# Altium schematic symbol library jlcpcb_2025_04_capacitors_extended_1206.schlib: 2503 symbols (part 13 of 14) (continued)
## TCC1206COG100J102ET
designator C?  Capacitance: 10pF  (hidden comment: *)
Capacitor, Ceramic (MLCC), 10pF, ±5%, 1kV, C0G, ±5%, SMD 1206; Manufacturer: CCTC; Manufacturer Part Number: TCC1206COG100J102ET; Package Size: 1206; JLCPCB Basic Part: No; JLCPCB Part Number: C282781; Supplier 1: LCSC; Category: Capacitors - MLCC; Supplier Part Number 1: C282781; Tolerance: ±5%; Voltage Rating: 1kV; Temperature Coefficient: C0G; RoHS: Yes; ComponentLink1Description: Datasheet; ComponentLink1URL: https://wmsc.lcsc.com/wmsc/upload/file/pdf/v2/lcsc/2304140030_CCTC-TCC1206COG100J102ET_C282781.pdf; ComponentLink2Description: JLCPCB Part URL; ComponentLink2URL: https://jlcpcb.com/partdetail/C282781; ComponentLink3Description: LCSC Part URL; ComponentLink3URL: https://lcsc.com/product-detail/Multilayer-Ceramic-Capacitors-MLCC---SMD-SMT_CCTC-CCTC-TCC1206COG100J102ET_C282781.html
footprint CAP-1206 (1206 (3216M) Capacitor)
pins: 1, 2

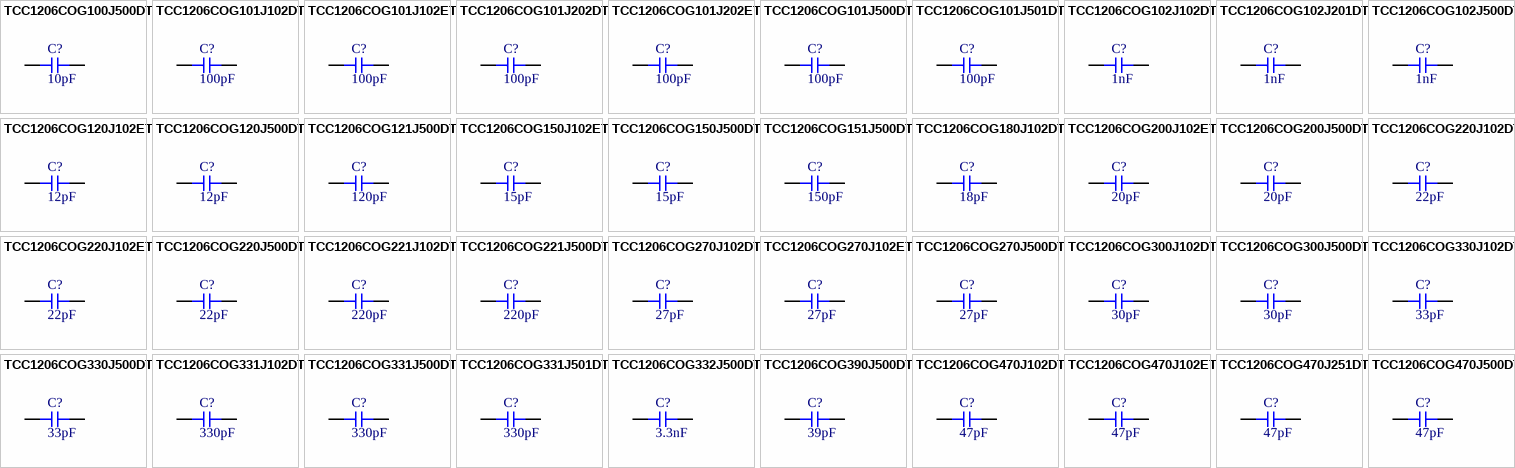
[diagram p56: symbols TCC1206COG100J500DT to TCC1206COG470J500DT]

## TCC1206COG100J500DT
designator C?  Capacitance: 10pF  (hidden comment: *)
Capacitor, Ceramic (MLCC), 10pF, ±5%, 50V, C0G, ±5%, SMD 1206; Manufacturer: CCTC; Manufacturer Part Number: TCC1206COG100J500DT; Package Size: 1206; JLCPCB Basic Part: No; JLCPCB Part Number: C377016; Supplier 1: LCSC; Category: Capacitors - MLCC; Supplier Part Number 1: C377016; Tolerance: ±5%; Voltage Rating: 50V; Temperature Coefficient: C0G; RoHS: Yes; ComponentLink1Description: Datasheet; ComponentLink1URL: https://wmsc.lcsc.com/wmsc/upload/file/pdf/v2/lcsc/2304140030_CCTC-TCC1206COG100J500DT_C377016.pdf; ComponentLink2Description: JLCPCB Part URL; ComponentLink2URL: https://jlcpcb.com/partdetail/C377016; ComponentLink3Description: LCSC Part URL; ComponentLink3URL: https://lcsc.com/product-detail/Multilayer-Ceramic-Capacitors-MLCC---SMD-SMT_CCTC-CCTC-TCC1206COG100J500DT_C377016.html
footprint CAP-1206 (1206 (3216M) Capacitor)
pins: 1, 2

## TCC1206COG101J102DT
designator C?  Capacitance: 100pF  (hidden comment: *)
Capacitor, Ceramic (MLCC), 100pF, ±5%, 1kV, C0G, ±5%, SMD 1206; Manufacturer: CCTC; Manufacturer Part Number: TCC1206COG101J102DT; Package Size: 1206; JLCPCB Basic Part: No; JLCPCB Part Number: C367316; Supplier 1: LCSC; Category: Capacitors - MLCC; Supplier Part Number 1: C367316; Tolerance: ±5%; Voltage Rating: 1kV; Temperature Coefficient: C0G; RoHS: Yes; ComponentLink1Description: Datasheet; ComponentLink1URL: https://wmsc.lcsc.com/wmsc/upload/file/pdf/v2/lcsc/2304140030_CCTC-TCC1206COG101J102DT_C367316.pdf; ComponentLink2Description: JLCPCB Part URL; ComponentLink2URL: https://jlcpcb.com/partdetail/C367316; ComponentLink3Description: LCSC Part URL; ComponentLink3URL: https://lcsc.com/product-detail/Multilayer-Ceramic-Capacitors-MLCC---SMD-SMT_CCTC-CCTC-TCC1206COG101J102DT_C367316.html
footprint CAP-1206 (1206 (3216M) Capacitor)
pins: 1, 2

## TCC1206COG101J102ET
designator C?  Capacitance: 100pF  (hidden comment: *)
Capacitor, Ceramic (MLCC), 100pF, ±5%, 1kV, C0G, ±5%, SMD 1206; Manufacturer: CCTC; Manufacturer Part Number: TCC1206COG101J102ET; Package Size: 1206; JLCPCB Basic Part: No; JLCPCB Part Number: C377018; Supplier 1: LCSC; Category: Capacitors - MLCC; Supplier Part Number 1: C377018; Tolerance: ±5%; Voltage Rating: 1kV; Temperature Coefficient: C0G; RoHS: Yes; ComponentLink1Description: Datasheet; ComponentLink1URL: https://wmsc.lcsc.com/wmsc/upload/file/pdf/v2/lcsc/2304140030_CCTC-TCC1206COG101J102ET_C377018.pdf; ComponentLink2Description: JLCPCB Part URL; ComponentLink2URL: https://jlcpcb.com/partdetail/C377018; ComponentLink3Description: LCSC Part URL; ComponentLink3URL: https://lcsc.com/product-detail/Multilayer-Ceramic-Capacitors-MLCC---SMD-SMT_CCTC-CCTC-TCC1206COG101J102ET_C377018.html
footprint CAP-1206 (1206 (3216M) Capacitor)
pins: 1, 2

## TCC1206COG101J202DT
designator C?  Capacitance: 100pF  (hidden comment: *)
Capacitor, Ceramic (MLCC), 100pF, ±5%, 2kV, C0G, ±5%, SMD 1206; Manufacturer: CCTC; Manufacturer Part Number: TCC1206COG101J202DT; Package Size: 1206; JLCPCB Basic Part: No; JLCPCB Part Number: C2833637; Supplier 1: LCSC; Category: Capacitors - MLCC; Supplier Part Number 1: C2833637; Tolerance: ±5%; Voltage Rating: 2kV; Temperature Coefficient: C0G; RoHS: Yes; ComponentLink1Description: Datasheet; ComponentLink1URL: https://wmsc.lcsc.com/wmsc/upload/file/pdf/v2/lcsc/2105241436_CCTC-TCC1206COG101J202DT_C2833637.pdf; ComponentLink2Description: JLCPCB Part URL; ComponentLink2URL: https://jlcpcb.com/partdetail/C2833637; ComponentLink3Description: LCSC Part URL; ComponentLink3URL: https://lcsc.com/product-detail/Multilayer-Ceramic-Capacitors-MLCC---SMD-SMT_CCTC-CCTC-TCC1206COG101J202DT_C2833637.html
footprint CAP-1206 (1206 (3216M) Capacitor)
pins: 1, 2

## TCC1206COG101J202ET
designator C?  Capacitance: 100pF  (hidden comment: *)
Capacitor, Ceramic (MLCC), 100pF, ±5%, 2kV, C0G, ±5%, SMD 1206; Manufacturer: CCTC; Manufacturer Part Number: TCC1206COG101J202ET; Package Size: 1206; JLCPCB Basic Part: No; JLCPCB Part Number: C282782; Supplier 1: LCSC; Category: Capacitors - MLCC; Supplier Part Number 1: C282782; Tolerance: ±5%; Voltage Rating: 2kV; Temperature Coefficient: C0G; RoHS: Yes; ComponentLink1Description: Datasheet; ComponentLink1URL: https://wmsc.lcsc.com/wmsc/upload/file/pdf/v2/lcsc/2304140030_CCTC-TCC1206COG101J202ET_C282782.pdf; ComponentLink2Description: JLCPCB Part URL; ComponentLink2URL: https://jlcpcb.com/partdetail/C282782; ComponentLink3Description: LCSC Part URL; ComponentLink3URL: https://lcsc.com/product-detail/Multilayer-Ceramic-Capacitors-MLCC---SMD-SMT_CCTC-CCTC-TCC1206COG101J202ET_C282782.html
footprint CAP-1206 (1206 (3216M) Capacitor)
pins: 1, 2

## TCC1206COG101J500DT
designator C?  Capacitance: 100pF  (hidden comment: *)
Capacitor, Ceramic (MLCC), 100pF, ±5%, 50V, C0G, ±5%, SMD 1206; Manufacturer: CCTC; Manufacturer Part Number: TCC1206COG101J500DT; Package Size: 1206; JLCPCB Basic Part: No; JLCPCB Part Number: C377019; Supplier 1: LCSC; Category: Capacitors - MLCC; Supplier Part Number 1: C377019; Tolerance: ±5%; Voltage Rating: 50V; Temperature Coefficient: C0G; RoHS: Yes; ComponentLink1Description: Datasheet; ComponentLink1URL: https://wmsc.lcsc.com/wmsc/upload/file/pdf/v2/lcsc/2304140030_CCTC-TCC1206COG101J500DT_C377019.pdf; ComponentLink2Description: JLCPCB Part URL; ComponentLink2URL: https://jlcpcb.com/partdetail/C377019; ComponentLink3Description: LCSC Part URL; ComponentLink3URL: https://lcsc.com/product-detail/Multilayer-Ceramic-Capacitors-MLCC---SMD-SMT_CCTC-CCTC-TCC1206COG101J500DT_C377019.html
footprint CAP-1206 (1206 (3216M) Capacitor)
pins: 1, 2

## TCC1206COG101J501DT
designator C?  Capacitance: 100pF  (hidden comment: *)
Capacitor, Ceramic (MLCC), 100pF, ±5%, 500V, C0G, ±5%, SMD 1206; Manufacturer: CCTC; Manufacturer Part Number: TCC1206COG101J501DT; Package Size: 1206; JLCPCB Basic Part: No; JLCPCB Part Number: C377020; Supplier 1: LCSC; Category: Capacitors - MLCC; Supplier Part Number 1: C377020; Tolerance: ±5%; Voltage Rating: 500V; Temperature Coefficient: C0G; RoHS: Yes; ComponentLink1Description: Datasheet; ComponentLink1URL: https://wmsc.lcsc.com/wmsc/upload/file/pdf/v2/lcsc/2304140030_CCTC-TCC1206COG101J501DT_C377020.pdf; ComponentLink2Description: JLCPCB Part URL; ComponentLink2URL: https://jlcpcb.com/partdetail/C377020; ComponentLink3Description: LCSC Part URL; ComponentLink3URL: https://lcsc.com/product-detail/Multilayer-Ceramic-Capacitors-MLCC---SMD-SMT_CCTC-CCTC-TCC1206COG101J501DT_C377020.html
footprint CAP-1206 (1206 (3216M) Capacitor)
pins: 1, 2

## TCC1206COG102J102DT
designator C?  Capacitance: 1nF  (hidden comment: *)
Capacitor, Ceramic (MLCC), 1nF, ±5%, 1kV, null, ±5%, SMD 1206; Manufacturer: CCTC; Manufacturer Part Number: TCC1206COG102J102DT; Package Size: 1206; JLCPCB Basic Part: No; JLCPCB Part Number: C5449043; Supplier 1: LCSC; Category: Capacitors - MLCC; Supplier Part Number 1: C5449043; Tolerance: ±5%; Voltage Rating: 1kV; Temperature Coefficient: null; RoHS: Yes; ComponentLink1Description: Datasheet; ComponentLink1URL: https://wmsc.lcsc.com/wmsc/upload/file/pdf/v2/lcsc/2403281714_CCTC-TCC1206COG102J102DT_C5449043.pdf; ComponentLink2Description: JLCPCB Part URL; ComponentLink2URL: https://jlcpcb.com/partdetail/C5449043; ComponentLink3Description: LCSC Part URL; ComponentLink3URL: https://lcsc.com/product-detail/Multilayer-Ceramic-Capacitors-MLCC---SMD-SMT_CCTC-CCTC-TCC1206COG102J102DT_C5449043.html
footprint CAP-1206 (1206 (3216M) Capacitor)
pins: 1, 2

## TCC1206COG102J201DT
designator C?  Capacitance: 1nF  (hidden comment: *)
Capacitor, Ceramic (MLCC), 1nF, ±5%, 200V, C0G, ±5%, SMD 1206; Manufacturer: CCTC; Manufacturer Part Number: TCC1206COG102J201DT; Package Size: 1206; JLCPCB Basic Part: No; JLCPCB Part Number: C377023; Supplier 1: LCSC; Category: Capacitors - MLCC; Supplier Part Number 1: C377023; Tolerance: ±5%; Voltage Rating: 200V; Temperature Coefficient: C0G; RoHS: Yes; ComponentLink1Description: Datasheet; ComponentLink1URL: https://wmsc.lcsc.com/wmsc/upload/file/pdf/v2/lcsc/2304140030_CCTC-TCC1206COG102J201DT_C377023.pdf; ComponentLink2Description: JLCPCB Part URL; ComponentLink2URL: https://jlcpcb.com/partdetail/C377023; ComponentLink3Description: LCSC Part URL; ComponentLink3URL: https://lcsc.com/product-detail/Multilayer-Ceramic-Capacitors-MLCC---SMD-SMT_CCTC-CCTC-TCC1206COG102J201DT_C377023.html
footprint CAP-1206 (1206 (3216M) Capacitor)
pins: 1, 2

## TCC1206COG102J500DT
designator C?  Capacitance: 1nF  (hidden comment: *)
Capacitor, Ceramic (MLCC), 1nF, ±5%, 50V, C0G, ±5%, SMD 1206; Manufacturer: CCTC; Manufacturer Part Number: TCC1206COG102J500DT; Package Size: 1206; JLCPCB Basic Part: No; JLCPCB Part Number: C282783; Supplier 1: LCSC; Category: Capacitors - MLCC; Supplier Part Number 1: C282783; Tolerance: ±5%; Voltage Rating: 50V; Temperature Coefficient: C0G; RoHS: Yes; ComponentLink1Description: Datasheet; ComponentLink1URL: https://wmsc.lcsc.com/wmsc/upload/file/pdf/v2/lcsc/2304140030_CCTC-TCC1206COG102J500DT_C282783.pdf; ComponentLink2Description: JLCPCB Part URL; ComponentLink2URL: https://jlcpcb.com/partdetail/C282783; ComponentLink3Description: LCSC Part URL; ComponentLink3URL: https://lcsc.com/product-detail/Multilayer-Ceramic-Capacitors-MLCC---SMD-SMT_CCTC-CCTC-TCC1206COG102J500DT_C282783.html
footprint CAP-1206 (1206 (3216M) Capacitor)
pins: 1, 2

## TCC1206COG120J102ET
designator C?  Capacitance: 12pF  (hidden comment: *)
Capacitor, Ceramic (MLCC), 12pF, ±5%, 1kV, C0G, ±5%, SMD 1206; Manufacturer: CCTC; Manufacturer Part Number: TCC1206COG120J102ET; Package Size: 1206; JLCPCB Basic Part: No; JLCPCB Part Number: C282784; Supplier 1: LCSC; Category: Capacitors - MLCC; Supplier Part Number 1: C282784; Tolerance: ±5%; Voltage Rating: 1kV; Temperature Coefficient: C0G; RoHS: Yes; ComponentLink1Description: Datasheet; ComponentLink1URL: https://wmsc.lcsc.com/wmsc/upload/file/pdf/v2/lcsc/2304140030_CCTC-TCC1206COG120J102ET_C282784.pdf; ComponentLink2Description: JLCPCB Part URL; ComponentLink2URL: https://jlcpcb.com/partdetail/C282784; ComponentLink3Description: LCSC Part URL; ComponentLink3URL: https://lcsc.com/product-detail/Multilayer-Ceramic-Capacitors-MLCC---SMD-SMT_CCTC-CCTC-TCC1206COG120J102ET_C282784.html
footprint CAP-1206 (1206 (3216M) Capacitor)
pins: 1, 2

## TCC1206COG120J500DT
designator C?  Capacitance: 12pF  (hidden comment: *)
Capacitor, Ceramic (MLCC), 12pF, ±5%, 50V, C0G, ±5%, SMD 1206; Manufacturer: CCTC; Manufacturer Part Number: TCC1206COG120J500DT; Package Size: 1206; JLCPCB Basic Part: No; JLCPCB Part Number: C282785; Supplier 1: LCSC; Category: Capacitors - MLCC; Supplier Part Number 1: C282785; Tolerance: ±5%; Voltage Rating: 50V; Temperature Coefficient: C0G; RoHS: Yes; ComponentLink1Description: Datasheet; ComponentLink1URL: https://wmsc.lcsc.com/wmsc/upload/file/pdf/v2/lcsc/2304140030_CCTC-TCC1206COG120J500DT_C282785.pdf; ComponentLink2Description: JLCPCB Part URL; ComponentLink2URL: https://jlcpcb.com/partdetail/C282785; ComponentLink3Description: LCSC Part URL; ComponentLink3URL: https://lcsc.com/product-detail/Multilayer-Ceramic-Capacitors-MLCC---SMD-SMT_CCTC-CCTC-TCC1206COG120J500DT_C282785.html
footprint CAP-1206 (1206 (3216M) Capacitor)
pins: 1, 2

## TCC1206COG121J500DT
designator C?  Capacitance: 120pF  (hidden comment: *)
Capacitor, Ceramic (MLCC), 120pF, ±5%, 50V, null, ±5%, SMD 1206; Manufacturer: CCTC; Manufacturer Part Number: TCC1206COG121J500DT; Package Size: 1206; JLCPCB Basic Part: No; JLCPCB Part Number: C5448927; Supplier 1: LCSC; Category: Capacitors - MLCC; Supplier Part Number 1: C5448927; Tolerance: ±5%; Voltage Rating: 50V; Temperature Coefficient: null; RoHS: Yes; ComponentLink1Description: Datasheet; ComponentLink1URL: https://wmsc.lcsc.com/wmsc/upload/file/pdf/v2/lcsc/2403281713_CCTC-TCC1206COG121J500DT_C5448927.pdf; ComponentLink2Description: JLCPCB Part URL; ComponentLink2URL: https://jlcpcb.com/partdetail/C5448927; ComponentLink3Description: LCSC Part URL; ComponentLink3URL: https://lcsc.com/product-detail/Multilayer-Ceramic-Capacitors-MLCC---SMD-SMT_CCTC-CCTC-TCC1206COG121J500DT_C5448927.html
footprint CAP-1206 (1206 (3216M) Capacitor)
pins: 1, 2

## TCC1206COG150J102ET
designator C?  Capacitance: 15pF  (hidden comment: *)
Capacitor, Ceramic (MLCC), 15pF, ±5%, 1kV, C0G, ±5%, SMD 1206; Manufacturer: CCTC; Manufacturer Part Number: TCC1206COG150J102ET; Package Size: 1206; JLCPCB Basic Part: No; JLCPCB Part Number: C282786; Supplier 1: LCSC; Category: Capacitors - MLCC; Supplier Part Number 1: C282786; Tolerance: ±5%; Voltage Rating: 1kV; Temperature Coefficient: C0G; RoHS: Yes; ComponentLink1Description: Datasheet; ComponentLink1URL: https://wmsc.lcsc.com/wmsc/upload/file/pdf/v2/lcsc/2304140030_CCTC-TCC1206COG150J102ET_C282786.pdf; ComponentLink2Description: JLCPCB Part URL; ComponentLink2URL: https://jlcpcb.com/partdetail/C282786; ComponentLink3Description: LCSC Part URL; ComponentLink3URL: https://lcsc.com/product-detail/Multilayer-Ceramic-Capacitors-MLCC---SMD-SMT_CCTC-CCTC-TCC1206COG150J102ET_C282786.html
footprint CAP-1206 (1206 (3216M) Capacitor)
pins: 1, 2

## TCC1206COG150J500DT
designator C?  Capacitance: 15pF  (hidden comment: *)
Capacitor, Ceramic (MLCC), 15pF, ±5%, 50V, C0G, ±5%, SMD 1206; Manufacturer: CCTC; Manufacturer Part Number: TCC1206COG150J500DT; Package Size: 1206; JLCPCB Basic Part: No; JLCPCB Part Number: C282787; Supplier 1: LCSC; Category: Capacitors - MLCC; Supplier Part Number 1: C282787; Tolerance: ±5%; Voltage Rating: 50V; Temperature Coefficient: C0G; RoHS: Yes; ComponentLink1Description: Datasheet; ComponentLink1URL: https://wmsc.lcsc.com/wmsc/upload/file/pdf/v2/lcsc/2304140030_CCTC-TCC1206COG150J500DT_C282787.pdf; ComponentLink2Description: JLCPCB Part URL; ComponentLink2URL: https://jlcpcb.com/partdetail/C282787; ComponentLink3Description: LCSC Part URL; ComponentLink3URL: https://lcsc.com/product-detail/Multilayer-Ceramic-Capacitors-MLCC---SMD-SMT_CCTC-CCTC-TCC1206COG150J500DT_C282787.html
footprint CAP-1206 (1206 (3216M) Capacitor)
pins: 1, 2

## TCC1206COG151J500DT
designator C?  Capacitance: 150pF  (hidden comment: *)
Capacitor, Ceramic (MLCC), 150pF, ±5%, 50V, C0G, ±5%, SMD 1206; Manufacturer: CCTC; Manufacturer Part Number: TCC1206COG151J500DT; Package Size: 1206; JLCPCB Basic Part: No; JLCPCB Part Number: C377025; Supplier 1: LCSC; Category: Capacitors - MLCC; Supplier Part Number 1: C377025; Tolerance: ±5%; Voltage Rating: 50V; Temperature Coefficient: C0G; RoHS: Yes; ComponentLink1Description: Datasheet; ComponentLink1URL: https://wmsc.lcsc.com/wmsc/upload/file/pdf/v2/lcsc/2304140030_CCTC-TCC1206COG151J500DT_C377025.pdf; ComponentLink2Description: JLCPCB Part URL; ComponentLink2URL: https://jlcpcb.com/partdetail/C377025; ComponentLink3Description: LCSC Part URL; ComponentLink3URL: https://lcsc.com/product-detail/Multilayer-Ceramic-Capacitors-MLCC---SMD-SMT_CCTC-CCTC-TCC1206COG151J500DT_C377025.html
footprint CAP-1206 (1206 (3216M) Capacitor)
pins: 1, 2

## TCC1206COG180J102DT
designator C?  Capacitance: 18pF  (hidden comment: *)
Capacitor, Ceramic (MLCC), 18pF, ±5%, 1kV, C0G, ±5%, SMD 1206; Manufacturer: CCTC; Manufacturer Part Number: TCC1206COG180J102DT; Package Size: 1206; JLCPCB Basic Part: No; JLCPCB Part Number: C2887022; Supplier 1: LCSC; Category: Capacitors - MLCC; Supplier Part Number 1: C2887022; Tolerance: ±5%; Voltage Rating: 1kV; Temperature Coefficient: C0G; RoHS: Yes; ComponentLink1Description: Datasheet; ComponentLink1URL: https://wmsc.lcsc.com/wmsc/upload/file/pdf/v2/lcsc/2108201530_CCTC-TCC1206COG180J102DT_C2887022.pdf; ComponentLink2Description: JLCPCB Part URL; ComponentLink2URL: https://jlcpcb.com/partdetail/C2887022; ComponentLink3Description: LCSC Part URL; ComponentLink3URL: https://lcsc.com/product-detail/Multilayer-Ceramic-Capacitors-MLCC---SMD-SMT_CCTC-CCTC-TCC1206COG180J102DT_C2887022.html
footprint CAP-1206 (1206 (3216M) Capacitor)
pins: 1, 2

## TCC1206COG200J102ET
designator C?  Capacitance: 20pF  (hidden comment: *)
Capacitor, Ceramic (MLCC), 20pF, ±5%, 1kV, C0G, ±5%, SMD 1206; Manufacturer: CCTC; Manufacturer Part Number: TCC1206COG200J102ET; Package Size: 1206; JLCPCB Basic Part: No; JLCPCB Part Number: C282789; Supplier 1: LCSC; Category: Capacitors - MLCC; Supplier Part Number 1: C282789; Tolerance: ±5%; Voltage Rating: 1kV; Temperature Coefficient: C0G; RoHS: Yes; ComponentLink1Description: Datasheet; ComponentLink1URL: https://wmsc.lcsc.com/wmsc/upload/file/pdf/v2/lcsc/2304140030_CCTC-TCC1206COG200J102ET_C282789.pdf; ComponentLink2Description: JLCPCB Part URL; ComponentLink2URL: https://jlcpcb.com/partdetail/C282789; ComponentLink3Description: LCSC Part URL; ComponentLink3URL: https://lcsc.com/product-detail/Multilayer-Ceramic-Capacitors-MLCC---SMD-SMT_CCTC-CCTC-TCC1206COG200J102ET_C282789.html
footprint CAP-1206 (1206 (3216M) Capacitor)
pins: 1, 2

## TCC1206COG200J500DT
designator C?  Capacitance: 20pF  (hidden comment: *)
Capacitor, Ceramic (MLCC), 20pF, ±5%, 50V, C0G, ±5%, SMD 1206; Manufacturer: CCTC; Manufacturer Part Number: TCC1206COG200J500DT; Package Size: 1206; JLCPCB Basic Part: No; JLCPCB Part Number: C377026; Supplier 1: LCSC; Category: Capacitors - MLCC; Supplier Part Number 1: C377026; Tolerance: ±5%; Voltage Rating: 50V; Temperature Coefficient: C0G; RoHS: Yes; ComponentLink1Description: Datasheet; ComponentLink1URL: https://wmsc.lcsc.com/wmsc/upload/file/pdf/v2/lcsc/2304140030_CCTC-TCC1206COG200J500DT_C377026.pdf; ComponentLink2Description: JLCPCB Part URL; ComponentLink2URL: https://jlcpcb.com/partdetail/C377026; ComponentLink3Description: LCSC Part URL; ComponentLink3URL: https://lcsc.com/product-detail/Multilayer-Ceramic-Capacitors-MLCC---SMD-SMT_CCTC-CCTC-TCC1206COG200J500DT_C377026.html
footprint CAP-1206 (1206 (3216M) Capacitor)
pins: 1, 2

## TCC1206COG220J102DT
designator C?  Capacitance: 22pF  (hidden comment: *)
Capacitor, Ceramic (MLCC), 22pF, ±5%, 1kV, C0G, ±5%, SMD 1206; Manufacturer: CCTC; Manufacturer Part Number: TCC1206COG220J102DT; Package Size: 1206; JLCPCB Basic Part: No; JLCPCB Part Number: C377027; Supplier 1: LCSC; Category: Capacitors - MLCC; Supplier Part Number 1: C377027; Tolerance: ±5%; Voltage Rating: 1kV; Temperature Coefficient: C0G; RoHS: Yes; ComponentLink1Description: Datasheet; ComponentLink1URL: https://wmsc.lcsc.com/wmsc/upload/file/pdf/v2/lcsc/2304140030_CCTC-TCC1206COG220J102DT_C377027.pdf; ComponentLink2Description: JLCPCB Part URL; ComponentLink2URL: https://jlcpcb.com/partdetail/C377027; ComponentLink3Description: LCSC Part URL; ComponentLink3URL: https://lcsc.com/product-detail/Multilayer-Ceramic-Capacitors-MLCC---SMD-SMT_CCTC-CCTC-TCC1206COG220J102DT_C377027.html
footprint CAP-1206 (1206 (3216M) Capacitor)
pins: 1, 2

## TCC1206COG220J102ET
designator C?  Capacitance: 22pF  (hidden comment: *)
Capacitor, Ceramic (MLCC), 22pF, ±5%, 1kV, C0G, ±5%, SMD 1206; Manufacturer: CCTC; Manufacturer Part Number: TCC1206COG220J102ET; Package Size: 1206; JLCPCB Basic Part: No; JLCPCB Part Number: C282790; Supplier 1: LCSC; Category: Capacitors - MLCC; Supplier Part Number 1: C282790; Tolerance: ±5%; Voltage Rating: 1kV; Temperature Coefficient: C0G; RoHS: Yes; ComponentLink1Description: Datasheet; ComponentLink1URL: https://wmsc.lcsc.com/wmsc/upload/file/pdf/v2/lcsc/2304140030_CCTC-TCC1206COG220J102ET_C282790.pdf; ComponentLink2Description: JLCPCB Part URL; ComponentLink2URL: https://jlcpcb.com/partdetail/C282790; ComponentLink3Description: LCSC Part URL; ComponentLink3URL: https://lcsc.com/product-detail/Multilayer-Ceramic-Capacitors-MLCC---SMD-SMT_CCTC-CCTC-TCC1206COG220J102ET_C282790.html
footprint CAP-1206 (1206 (3216M) Capacitor)
pins: 1, 2

## TCC1206COG220J500DT
designator C?  Capacitance: 22pF  (hidden comment: *)
Capacitor, Ceramic (MLCC), 22pF, ±5%, 50V, C0G, ±5%, SMD 1206; Manufacturer: CCTC; Manufacturer Part Number: TCC1206COG220J500DT; Package Size: 1206; JLCPCB Basic Part: No; JLCPCB Part Number: C377028; Supplier 1: LCSC; Category: Capacitors - MLCC; Supplier Part Number 1: C377028; Tolerance: ±5%; Voltage Rating: 50V; Temperature Coefficient: C0G; RoHS: Yes; ComponentLink1Description: Datasheet; ComponentLink1URL: https://wmsc.lcsc.com/wmsc/upload/file/pdf/v2/lcsc/2304140030_CCTC-TCC1206COG220J500DT_C377028.pdf; ComponentLink2Description: JLCPCB Part URL; ComponentLink2URL: https://jlcpcb.com/partdetail/C377028; ComponentLink3Description: LCSC Part URL; ComponentLink3URL: https://lcsc.com/product-detail/Multilayer-Ceramic-Capacitors-MLCC---SMD-SMT_CCTC-CCTC-TCC1206COG220J500DT_C377028.html
footprint CAP-1206 (1206 (3216M) Capacitor)
pins: 1, 2

## TCC1206COG221J102DT
designator C?  Capacitance: 220pF  (hidden comment: *)
Capacitor, Ceramic (MLCC), 220pF, ±5%, 1kV, C0G, ±5%, SMD 1206; Manufacturer: CCTC; Manufacturer Part Number: TCC1206COG221J102DT; Package Size: 1206; JLCPCB Basic Part: No; JLCPCB Part Number: C377029; Supplier 1: LCSC; Category: Capacitors - MLCC; Supplier Part Number 1: C377029; Tolerance: ±5%; Voltage Rating: 1kV; Temperature Coefficient: C0G; RoHS: Yes; ComponentLink1Description: Datasheet; ComponentLink1URL: https://wmsc.lcsc.com/wmsc/upload/file/pdf/v2/lcsc/2304140030_CCTC-TCC1206COG221J102DT_C377029.pdf; ComponentLink2Description: JLCPCB Part URL; ComponentLink2URL: https://jlcpcb.com/partdetail/C377029; ComponentLink3Description: LCSC Part URL; ComponentLink3URL: https://lcsc.com/product-detail/Multilayer-Ceramic-Capacitors-MLCC---SMD-SMT_CCTC-CCTC-TCC1206COG221J102DT_C377029.html
footprint CAP-1206 (1206 (3216M) Capacitor)
pins: 1, 2

## TCC1206COG221J500DT
designator C?  Capacitance: 220pF  (hidden comment: *)
Capacitor, Ceramic (MLCC), 220pF, ±5%, 50V, C0G, ±5%, SMD 1206; Manufacturer: CCTC; Manufacturer Part Number: TCC1206COG221J500DT; Package Size: 1206; JLCPCB Basic Part: No; JLCPCB Part Number: C367313; Supplier 1: LCSC; Category: Capacitors - MLCC; Supplier Part Number 1: C367313; Tolerance: ±5%; Voltage Rating: 50V; Temperature Coefficient: C0G; RoHS: Yes; ComponentLink1Description: Datasheet; ComponentLink1URL: https://wmsc.lcsc.com/wmsc/upload/file/pdf/v2/lcsc/2304140030_CCTC-TCC1206COG221J500DT_C367313.pdf; ComponentLink2Description: JLCPCB Part URL; ComponentLink2URL: https://jlcpcb.com/partdetail/C367313; ComponentLink3Description: LCSC Part URL; ComponentLink3URL: https://lcsc.com/product-detail/Multilayer-Ceramic-Capacitors-MLCC---SMD-SMT_CCTC-CCTC-TCC1206COG221J500DT_C367313.html
footprint CAP-1206 (1206 (3216M) Capacitor)
pins: 1, 2

## TCC1206COG270J102DT
designator C?  Capacitance: 27pF  (hidden comment: *)
Capacitor, Ceramic (MLCC), 27pF, ±5%, 1kV, C0G, ±5%, SMD 1206; Manufacturer: CCTC; Manufacturer Part Number: TCC1206COG270J102DT; Package Size: 1206; JLCPCB Basic Part: No; JLCPCB Part Number: C696897; Supplier 1: LCSC; Category: Capacitors - MLCC; Supplier Part Number 1: C696897; Tolerance: ±5%; Voltage Rating: 1kV; Temperature Coefficient: C0G; RoHS: Yes; ComponentLink1Description: Datasheet; ComponentLink1URL: https://wmsc.lcsc.com/wmsc/upload/file/pdf/v2/lcsc/2304140030_CCTC-TCC1206COG270J102DT_C696897.pdf; ComponentLink2Description: JLCPCB Part URL; ComponentLink2URL: https://jlcpcb.com/partdetail/C696897; ComponentLink3Description: LCSC Part URL; ComponentLink3URL: https://lcsc.com/product-detail/Multilayer-Ceramic-Capacitors-MLCC---SMD-SMT_CCTC-CCTC-TCC1206COG270J102DT_C696897.html
footprint CAP-1206 (1206 (3216M) Capacitor)
pins: 1, 2

## TCC1206COG270J102ET
designator C?  Capacitance: 27pF  (hidden comment: *)
Capacitor, Ceramic (MLCC), 27pF, ±5%, 1kV, C0G, ±5%, SMD 1206; Manufacturer: CCTC; Manufacturer Part Number: TCC1206COG270J102ET; Package Size: 1206; JLCPCB Basic Part: No; JLCPCB Part Number: C377030; Supplier 1: LCSC; Category: Capacitors - MLCC; Supplier Part Number 1: C377030; Tolerance: ±5%; Voltage Rating: 1kV; Temperature Coefficient: C0G; RoHS: Yes; ComponentLink1Description: Datasheet; ComponentLink1URL: https://wmsc.lcsc.com/wmsc/upload/file/pdf/v2/lcsc/2304140030_CCTC-TCC1206COG270J102ET_C377030.pdf; ComponentLink2Description: JLCPCB Part URL; ComponentLink2URL: https://jlcpcb.com/partdetail/C377030; ComponentLink3Description: LCSC Part URL; ComponentLink3URL: https://lcsc.com/product-detail/Multilayer-Ceramic-Capacitors-MLCC---SMD-SMT_CCTC-CCTC-TCC1206COG270J102ET_C377030.html
footprint CAP-1206 (1206 (3216M) Capacitor)
pins: 1, 2

## TCC1206COG270J500DT
designator C?  Capacitance: 27pF  (hidden comment: *)
Capacitor, Ceramic (MLCC), 27pF, ±5%, 50V, C0G, ±5%, SMD 1206; Manufacturer: CCTC; Manufacturer Part Number: TCC1206COG270J500DT; Package Size: 1206; JLCPCB Basic Part: No; JLCPCB Part Number: C377031; Supplier 1: LCSC; Category: Capacitors - MLCC; Supplier Part Number 1: C377031; Tolerance: ±5%; Voltage Rating: 50V; Temperature Coefficient: C0G; RoHS: Yes; ComponentLink1Description: Datasheet; ComponentLink1URL: https://wmsc.lcsc.com/wmsc/upload/file/pdf/v2/lcsc/2304140030_CCTC-TCC1206COG270J500DT_C377031.pdf; ComponentLink2Description: JLCPCB Part URL; ComponentLink2URL: https://jlcpcb.com/partdetail/C377031; ComponentLink3Description: LCSC Part URL; ComponentLink3URL: https://lcsc.com/product-detail/Multilayer-Ceramic-Capacitors-MLCC---SMD-SMT_CCTC-CCTC-TCC1206COG270J500DT_C377031.html
footprint CAP-1206 (1206 (3216M) Capacitor)
pins: 1, 2

## TCC1206COG300J102DT
designator C?  Capacitance: 30pF  (hidden comment: *)
Capacitor, Ceramic (MLCC), 30pF, ±5%, 1kV, null, ±5%, SMD 1206; Manufacturer: CCTC; Manufacturer Part Number: TCC1206COG300J102DT; Package Size: 1206; JLCPCB Basic Part: No; JLCPCB Part Number: C7393971; Supplier 1: LCSC; Category: Capacitors - MLCC; Supplier Part Number 1: C7393971; Tolerance: ±5%; Voltage Rating: 1kV; Temperature Coefficient: null; RoHS: Yes; ComponentLink1Description: Datasheet; ComponentLink1URL: https://wmsc.lcsc.com/wmsc/upload/file/pdf/v2/lcsc/2306211528_CCTC-TCC1206COG300J102DT_C7393971.pdf; ComponentLink2Description: JLCPCB Part URL; ComponentLink2URL: https://jlcpcb.com/partdetail/C7393971; ComponentLink3Description: LCSC Part URL; ComponentLink3URL: https://lcsc.com/product-detail/Multilayer-Ceramic-Capacitors-MLCC---SMD-SMT_CCTC-CCTC-TCC1206COG300J102DT_C7393971.html
footprint CAP-1206 (1206 (3216M) Capacitor)
pins: 1, 2

## TCC1206COG300J500DT
designator C?  Capacitance: 30pF  (hidden comment: *)
Capacitor, Ceramic (MLCC), 30pF, ±5%, 50V, C0G, ±5%, SMD 1206; Manufacturer: CCTC; Manufacturer Part Number: TCC1206COG300J500DT; Package Size: 1206; JLCPCB Basic Part: No; JLCPCB Part Number: C282791; Supplier 1: LCSC; Category: Capacitors - MLCC; Supplier Part Number 1: C282791; Tolerance: ±5%; Voltage Rating: 50V; Temperature Coefficient: C0G; RoHS: Yes; ComponentLink1Description: Datasheet; ComponentLink1URL: https://wmsc.lcsc.com/wmsc/upload/file/pdf/v2/lcsc/2304140030_CCTC-TCC1206COG300J500DT_C282791.pdf; ComponentLink2Description: JLCPCB Part URL; ComponentLink2URL: https://jlcpcb.com/partdetail/C282791; ComponentLink3Description: LCSC Part URL; ComponentLink3URL: https://lcsc.com/product-detail/Multilayer-Ceramic-Capacitors-MLCC---SMD-SMT_CCTC-CCTC-TCC1206COG300J500DT_C282791.html
footprint CAP-1206 (1206 (3216M) Capacitor)
pins: 1, 2

## TCC1206COG330J102DT
designator C?  Capacitance: 33pF  (hidden comment: *)
Capacitor, Ceramic (MLCC), 33pF, ±5%, 1kV, C0G, ±5%, SMD 1206; Manufacturer: CCTC; Manufacturer Part Number: TCC1206COG330J102DT; Package Size: 1206; JLCPCB Basic Part: No; JLCPCB Part Number: C377032; Supplier 1: LCSC; Category: Capacitors - MLCC; Supplier Part Number 1: C377032; Tolerance: ±5%; Voltage Rating: 1kV; Temperature Coefficient: C0G; RoHS: Yes; ComponentLink1Description: Datasheet; ComponentLink1URL: https://wmsc.lcsc.com/wmsc/upload/file/pdf/v2/lcsc/2304140030_CCTC-TCC1206COG330J102DT_C377032.pdf; ComponentLink2Description: JLCPCB Part URL; ComponentLink2URL: https://jlcpcb.com/partdetail/C377032; ComponentLink3Description: LCSC Part URL; ComponentLink3URL: https://lcsc.com/product-detail/Multilayer-Ceramic-Capacitors-MLCC---SMD-SMT_CCTC-CCTC-TCC1206COG330J102DT_C377032.html
footprint CAP-1206 (1206 (3216M) Capacitor)
pins: 1, 2

## TCC1206COG330J500DT
designator C?  Capacitance: 33pF  (hidden comment: *)
Capacitor, Ceramic (MLCC), 33pF, ±5%, 50V, C0G, ±5%, SMD 1206; Manufacturer: CCTC; Manufacturer Part Number: TCC1206COG330J500DT; Package Size: 1206; JLCPCB Basic Part: No; JLCPCB Part Number: C377035; Supplier 1: LCSC; Category: Capacitors - MLCC; Supplier Part Number 1: C377035; Tolerance: ±5%; Voltage Rating: 50V; Temperature Coefficient: C0G; RoHS: Yes; ComponentLink1Description: Datasheet; ComponentLink1URL: https://wmsc.lcsc.com/wmsc/upload/file/pdf/v2/lcsc/2304140030_CCTC-TCC1206COG330J500DT_C377035.pdf; ComponentLink2Description: JLCPCB Part URL; ComponentLink2URL: https://jlcpcb.com/partdetail/C377035; ComponentLink3Description: LCSC Part URL; ComponentLink3URL: https://lcsc.com/product-detail/Multilayer-Ceramic-Capacitors-MLCC---SMD-SMT_CCTC-CCTC-TCC1206COG330J500DT_C377035.html
footprint CAP-1206 (1206 (3216M) Capacitor)
pins: 1, 2

## TCC1206COG331J102DT
designator C?  Capacitance: 330pF  (hidden comment: *)
Capacitor, Ceramic (MLCC), 330pF, ±5%, 1kV, C0G, ±5%, SMD 1206; Manufacturer: CCTC; Manufacturer Part Number: TCC1206COG331J102DT; Package Size: 1206; JLCPCB Basic Part: No; JLCPCB Part Number: C282792; Supplier 1: LCSC; Category: Capacitors - MLCC; Supplier Part Number 1: C282792; Tolerance: ±5%; Voltage Rating: 1kV; Temperature Coefficient: C0G; RoHS: Yes; ComponentLink1Description: Datasheet; ComponentLink1URL: https://wmsc.lcsc.com/wmsc/upload/file/pdf/v2/lcsc/2304140030_CCTC-TCC1206COG331J102DT_C282792.pdf; ComponentLink2Description: JLCPCB Part URL; ComponentLink2URL: https://jlcpcb.com/partdetail/C282792; ComponentLink3Description: LCSC Part URL; ComponentLink3URL: https://lcsc.com/product-detail/Multilayer-Ceramic-Capacitors-MLCC---SMD-SMT_CCTC-CCTC-TCC1206COG331J102DT_C282792.html
footprint CAP-1206 (1206 (3216M) Capacitor)
pins: 1, 2

## TCC1206COG331J500DT
designator C?  Capacitance: 330pF  (hidden comment: *)
Capacitor, Ceramic (MLCC), 330pF, ±5%, 50V, C0G, ±5%, SMD 1206; Manufacturer: CCTC; Manufacturer Part Number: TCC1206COG331J500DT; Package Size: 1206; JLCPCB Basic Part: No; JLCPCB Part Number: C367314; Supplier 1: LCSC; Category: Capacitors - MLCC; Supplier Part Number 1: C367314; Tolerance: ±5%; Voltage Rating: 50V; Temperature Coefficient: C0G; RoHS: Yes; ComponentLink1Description: Datasheet; ComponentLink1URL: https://wmsc.lcsc.com/wmsc/upload/file/pdf/v2/lcsc/2304140030_CCTC-TCC1206COG331J500DT_C367314.pdf; ComponentLink2Description: JLCPCB Part URL; ComponentLink2URL: https://jlcpcb.com/partdetail/C367314; ComponentLink3Description: LCSC Part URL; ComponentLink3URL: https://lcsc.com/product-detail/Multilayer-Ceramic-Capacitors-MLCC---SMD-SMT_CCTC-CCTC-TCC1206COG331J500DT_C367314.html
footprint CAP-1206 (1206 (3216M) Capacitor)
pins: 1, 2

## TCC1206COG331J501DT
designator C?  Capacitance: 330pF  (hidden comment: *)
Capacitor, Ceramic (MLCC), 330pF, ±5%, 500V, C0G, ±5%, SMD 1206; Manufacturer: CCTC; Manufacturer Part Number: TCC1206COG331J501DT; Package Size: 1206; JLCPCB Basic Part: No; JLCPCB Part Number: C377037; Supplier 1: LCSC; Category: Capacitors - MLCC; Supplier Part Number 1: C377037; Tolerance: ±5%; Voltage Rating: 500V; Temperature Coefficient: C0G; RoHS: Yes; ComponentLink1Description: Datasheet; ComponentLink1URL: https://wmsc.lcsc.com/wmsc/upload/file/pdf/v2/lcsc/2304140030_CCTC-TCC1206COG331J501DT_C377037.pdf; ComponentLink2Description: JLCPCB Part URL; ComponentLink2URL: https://jlcpcb.com/partdetail/C377037; ComponentLink3Description: LCSC Part URL; ComponentLink3URL: https://lcsc.com/product-detail/Multilayer-Ceramic-Capacitors-MLCC---SMD-SMT_CCTC-CCTC-TCC1206COG331J501DT_C377037.html
footprint CAP-1206 (1206 (3216M) Capacitor)
pins: 1, 2

## TCC1206COG332J500DT
designator C?  Capacitance: 3.3nF  (hidden comment: *)
Capacitor, Ceramic (MLCC), 3.3nF, ±5%, 50V, C0G, ±5%, SMD 1206; Manufacturer: CCTC; Manufacturer Part Number: TCC1206COG332J500DT; Package Size: 1206; JLCPCB Basic Part: No; JLCPCB Part Number: C380354; Supplier 1: LCSC; Category: Capacitors - MLCC; Supplier Part Number 1: C380354; Tolerance: ±5%; Voltage Rating: 50V; Temperature Coefficient: C0G; RoHS: Yes; ComponentLink1Description: Datasheet; ComponentLink1URL: https://wmsc.lcsc.com/wmsc/upload/file/pdf/v2/lcsc/2304140030_CCTC-TCC1206COG332J500DT_C380354.pdf; ComponentLink2Description: JLCPCB Part URL; ComponentLink2URL: https://jlcpcb.com/partdetail/C380354; ComponentLink3Description: LCSC Part URL; ComponentLink3URL: https://lcsc.com/product-detail/Multilayer-Ceramic-Capacitors-MLCC---SMD-SMT_CCTC-CCTC-TCC1206COG332J500DT_C380354.html
footprint CAP-1206 (1206 (3216M) Capacitor)
pins: 1, 2

## TCC1206COG390J500DT
designator C?  Capacitance: 39pF  (hidden comment: *)
Capacitor, Ceramic (MLCC), 39pF, ±5%, 50V, C0G, ±5%, SMD 1206; Manufacturer: CCTC; Manufacturer Part Number: TCC1206COG390J500DT; Package Size: 1206; JLCPCB Basic Part: No; JLCPCB Part Number: C282793; Supplier 1: LCSC; Category: Capacitors - MLCC; Supplier Part Number 1: C282793; Tolerance: ±5%; Voltage Rating: 50V; Temperature Coefficient: C0G; RoHS: Yes; ComponentLink1Description: Datasheet; ComponentLink1URL: https://wmsc.lcsc.com/wmsc/upload/file/pdf/v2/lcsc/2304140030_CCTC-TCC1206COG390J500DT_C282793.pdf; ComponentLink2Description: JLCPCB Part URL; ComponentLink2URL: https://jlcpcb.com/partdetail/C282793; ComponentLink3Description: LCSC Part URL; ComponentLink3URL: https://lcsc.com/product-detail/Multilayer-Ceramic-Capacitors-MLCC---SMD-SMT_CCTC-CCTC-TCC1206COG390J500DT_C282793.html
footprint CAP-1206 (1206 (3216M) Capacitor)
pins: 1, 2

## TCC1206COG470J102DT
designator C?  Capacitance: 47pF  (hidden comment: *)
Capacitor, Ceramic (MLCC), 47pF, ±5%, 1kV, C0G, ±5%, SMD 1206; Manufacturer: CCTC; Manufacturer Part Number: TCC1206COG470J102DT; Package Size: 1206; JLCPCB Basic Part: No; JLCPCB Part Number: C377038; Supplier 1: LCSC; Category: Capacitors - MLCC; Supplier Part Number 1: C377038; Tolerance: ±5%; Voltage Rating: 1kV; Temperature Coefficient: C0G; RoHS: Yes; ComponentLink1Description: Datasheet; ComponentLink1URL: https://wmsc.lcsc.com/wmsc/upload/file/pdf/v2/lcsc/2304140030_CCTC-TCC1206COG470J102DT_C377038.pdf; ComponentLink2Description: JLCPCB Part URL; ComponentLink2URL: https://jlcpcb.com/partdetail/C377038; ComponentLink3Description: LCSC Part URL; ComponentLink3URL: https://lcsc.com/product-detail/Multilayer-Ceramic-Capacitors-MLCC---SMD-SMT_CCTC-CCTC-TCC1206COG470J102DT_C377038.html
footprint CAP-1206 (1206 (3216M) Capacitor)
pins: 1, 2

## TCC1206COG470J102ET
designator C?  Capacitance: 47pF  (hidden comment: *)
Capacitor, Ceramic (MLCC), 47pF, ±5%, 1kV, C0G, ±5%, SMD 1206; Manufacturer: CCTC; Manufacturer Part Number: TCC1206COG470J102ET; Package Size: 1206; JLCPCB Basic Part: No; JLCPCB Part Number: C282795; Supplier 1: LCSC; Category: Capacitors - MLCC; Supplier Part Number 1: C282795; Tolerance: ±5%; Voltage Rating: 1kV; Temperature Coefficient: C0G; RoHS: Yes; ComponentLink1Description: Datasheet; ComponentLink1URL: https://wmsc.lcsc.com/wmsc/upload/file/pdf/v2/lcsc/2304140030_CCTC-TCC1206COG470J102ET_C282795.pdf; ComponentLink2Description: JLCPCB Part URL; ComponentLink2URL: https://jlcpcb.com/partdetail/C282795; ComponentLink3Description: LCSC Part URL; ComponentLink3URL: https://lcsc.com/product-detail/Multilayer-Ceramic-Capacitors-MLCC---SMD-SMT_CCTC-CCTC-TCC1206COG470J102ET_C282795.html
footprint CAP-1206 (1206 (3216M) Capacitor)
pins: 1, 2

## TCC1206COG470J251DT
designator C?  Capacitance: 47pF  (hidden comment: *)
Capacitor, Ceramic (MLCC), 47pF, ±5%, 250V, C0G, ±5%, SMD 1206; Manufacturer: CCTC; Manufacturer Part Number: TCC1206COG470J251DT; Package Size: 1206; JLCPCB Basic Part: No; JLCPCB Part Number: C282796; Supplier 1: LCSC; Category: Capacitors - MLCC; Supplier Part Number 1: C282796; Tolerance: ±5%; Voltage Rating: 250V; Temperature Coefficient: C0G; RoHS: Yes; ComponentLink1Description: Datasheet; ComponentLink1URL: https://wmsc.lcsc.com/wmsc/upload/file/pdf/v2/lcsc/2304140030_CCTC-TCC1206COG470J251DT_C282796.pdf; ComponentLink2Description: JLCPCB Part URL; ComponentLink2URL: https://jlcpcb.com/partdetail/C282796; ComponentLink3Description: LCSC Part URL; ComponentLink3URL: https://lcsc.com/product-detail/Multilayer-Ceramic-Capacitors-MLCC---SMD-SMT_CCTC-CCTC-TCC1206COG470J251DT_C282796.html
footprint CAP-1206 (1206 (3216M) Capacitor)
pins: 1, 2

## TCC1206COG470J500DT
designator C?  Capacitance: 47pF  (hidden comment: *)
Capacitor, Ceramic (MLCC), 47pF, ±5%, 50V, C0G, ±5%, SMD 1206; Manufacturer: CCTC; Manufacturer Part Number: TCC1206COG470J500DT; Package Size: 1206; JLCPCB Basic Part: No; JLCPCB Part Number: C282797; Supplier 1: LCSC; Category: Capacitors - MLCC; Supplier Part Number 1: C282797; Tolerance: ±5%; Voltage Rating: 50V; Temperature Coefficient: C0G; RoHS: Yes; ComponentLink1Description: Datasheet; ComponentLink1URL: https://wmsc.lcsc.com/wmsc/upload/file/pdf/v2/lcsc/2304140030_CCTC-TCC1206COG470J500DT_C282797.pdf; ComponentLink2Description: JLCPCB Part URL; ComponentLink2URL: https://jlcpcb.com/partdetail/C282797; ComponentLink3Description: LCSC Part URL; ComponentLink3URL: https://lcsc.com/product-detail/Multilayer-Ceramic-Capacitors-MLCC---SMD-SMT_CCTC-CCTC-TCC1206COG470J500DT_C282797.html
footprint CAP-1206 (1206 (3216M) Capacitor)
pins: 1, 2

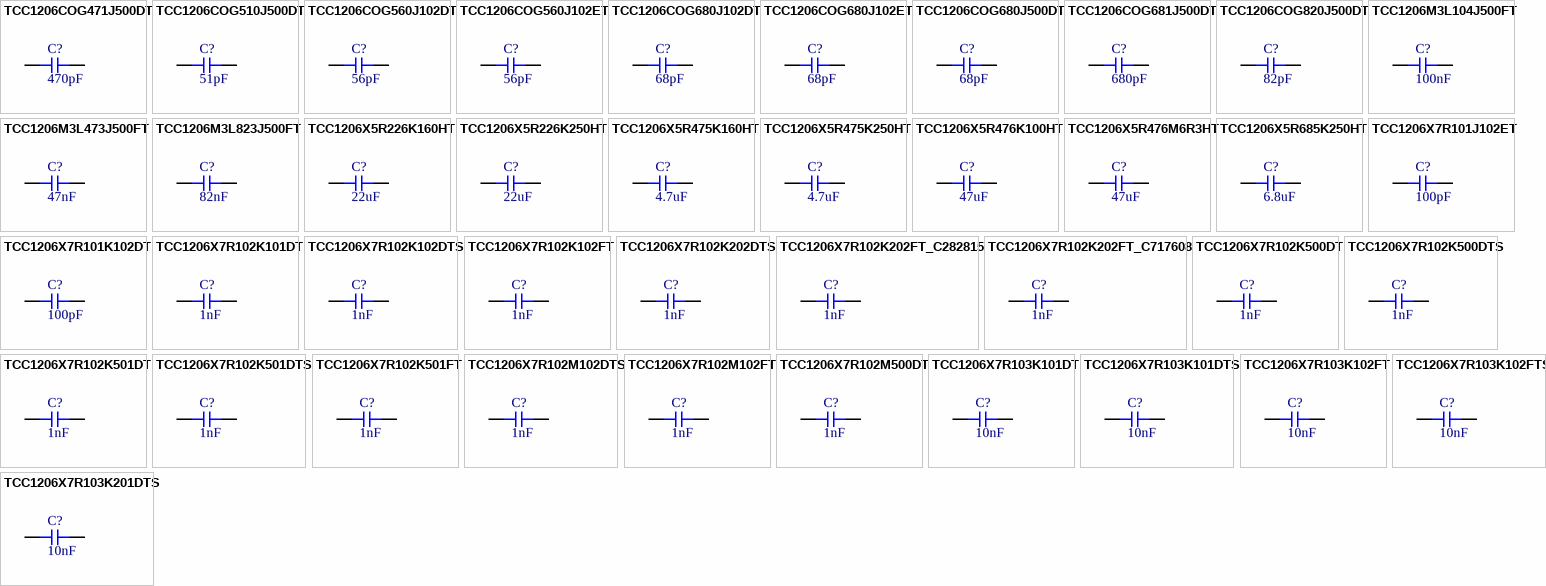
[diagram p57: symbols TCC1206COG471J500DT to TCC1206X7R103K201DTS]

## TCC1206COG471J500DT
designator C?  Capacitance: 470pF  (hidden comment: *)
Capacitor, Ceramic (MLCC), 470pF, ±5%, 50V, C0G, ±5%, SMD 1206; Manufacturer: CCTC; Manufacturer Part Number: TCC1206COG471J500DT; Package Size: 1206; JLCPCB Basic Part: No; JLCPCB Part Number: C282798; Supplier 1: LCSC; Category: Capacitors - MLCC; Supplier Part Number 1: C282798; Tolerance: ±5%; Voltage Rating: 50V; Temperature Coefficient: C0G; RoHS: Yes; ComponentLink1Description: Datasheet; ComponentLink1URL: https://wmsc.lcsc.com/wmsc/upload/file/pdf/v2/lcsc/2304140030_CCTC-TCC1206COG471J500DT_C282798.pdf; ComponentLink2Description: JLCPCB Part URL; ComponentLink2URL: https://jlcpcb.com/partdetail/C282798; ComponentLink3Description: LCSC Part URL; ComponentLink3URL: https://lcsc.com/product-detail/Multilayer-Ceramic-Capacitors-MLCC---SMD-SMT_CCTC-CCTC-TCC1206COG471J500DT_C282798.html
footprint CAP-1206 (1206 (3216M) Capacitor)
pins: 1, 2

## TCC1206COG510J500DT
designator C?  Capacitance: 51pF  (hidden comment: *)
Capacitor, Ceramic (MLCC), 51pF, ±5%, 50V, C0G, ±5%, SMD 1206; Manufacturer: CCTC; Manufacturer Part Number: TCC1206COG510J500DT; Package Size: 1206; JLCPCB Basic Part: No; JLCPCB Part Number: C282799; Supplier 1: LCSC; Category: Capacitors - MLCC; Supplier Part Number 1: C282799; Tolerance: ±5%; Voltage Rating: 50V; Temperature Coefficient: C0G; RoHS: Yes; ComponentLink1Description: Datasheet; ComponentLink1URL: https://wmsc.lcsc.com/wmsc/upload/file/pdf/v2/lcsc/2304140030_CCTC-TCC1206COG510J500DT_C282799.pdf; ComponentLink2Description: JLCPCB Part URL; ComponentLink2URL: https://jlcpcb.com/partdetail/C282799; ComponentLink3Description: LCSC Part URL; ComponentLink3URL: https://lcsc.com/product-detail/Multilayer-Ceramic-Capacitors-MLCC---SMD-SMT_CCTC-CCTC-TCC1206COG510J500DT_C282799.html
footprint CAP-1206 (1206 (3216M) Capacitor)
pins: 1, 2

## TCC1206COG560J102DT
designator C?  Capacitance: 56pF  (hidden comment: *)
Capacitor, Ceramic (MLCC), 56pF, ±5%, 1kV, C0G, ±5%, SMD 1206; Manufacturer: CCTC; Manufacturer Part Number: TCC1206COG560J102DT; Package Size: 1206; JLCPCB Basic Part: No; JLCPCB Part Number: C377040; Supplier 1: LCSC; Category: Capacitors - MLCC; Supplier Part Number 1: C377040; Tolerance: ±5%; Voltage Rating: 1kV; Temperature Coefficient: C0G; RoHS: Yes; ComponentLink1Description: Datasheet; ComponentLink1URL: https://wmsc.lcsc.com/wmsc/upload/file/pdf/v2/lcsc/2304140030_CCTC-TCC1206COG560J102DT_C377040.pdf; ComponentLink2Description: JLCPCB Part URL; ComponentLink2URL: https://jlcpcb.com/partdetail/C377040; ComponentLink3Description: LCSC Part URL; ComponentLink3URL: https://lcsc.com/product-detail/Multilayer-Ceramic-Capacitors-MLCC---SMD-SMT_CCTC-CCTC-TCC1206COG560J102DT_C377040.html
footprint CAP-1206 (1206 (3216M) Capacitor)
pins: 1, 2
